# Altium footprint library lib_datalogger.PcbLib: 866 footprints (part 40 of 55)
Each footprint in its own frame and in the unit in brackets; x right, y up, seen from the top. Pads: shape width x height; smd on the part's side, far side on the other; paste and mask are expansions set on the pad; w line width, h text height; cw(c..) or ccw(c..) is an arc to the next point about the centre after c.
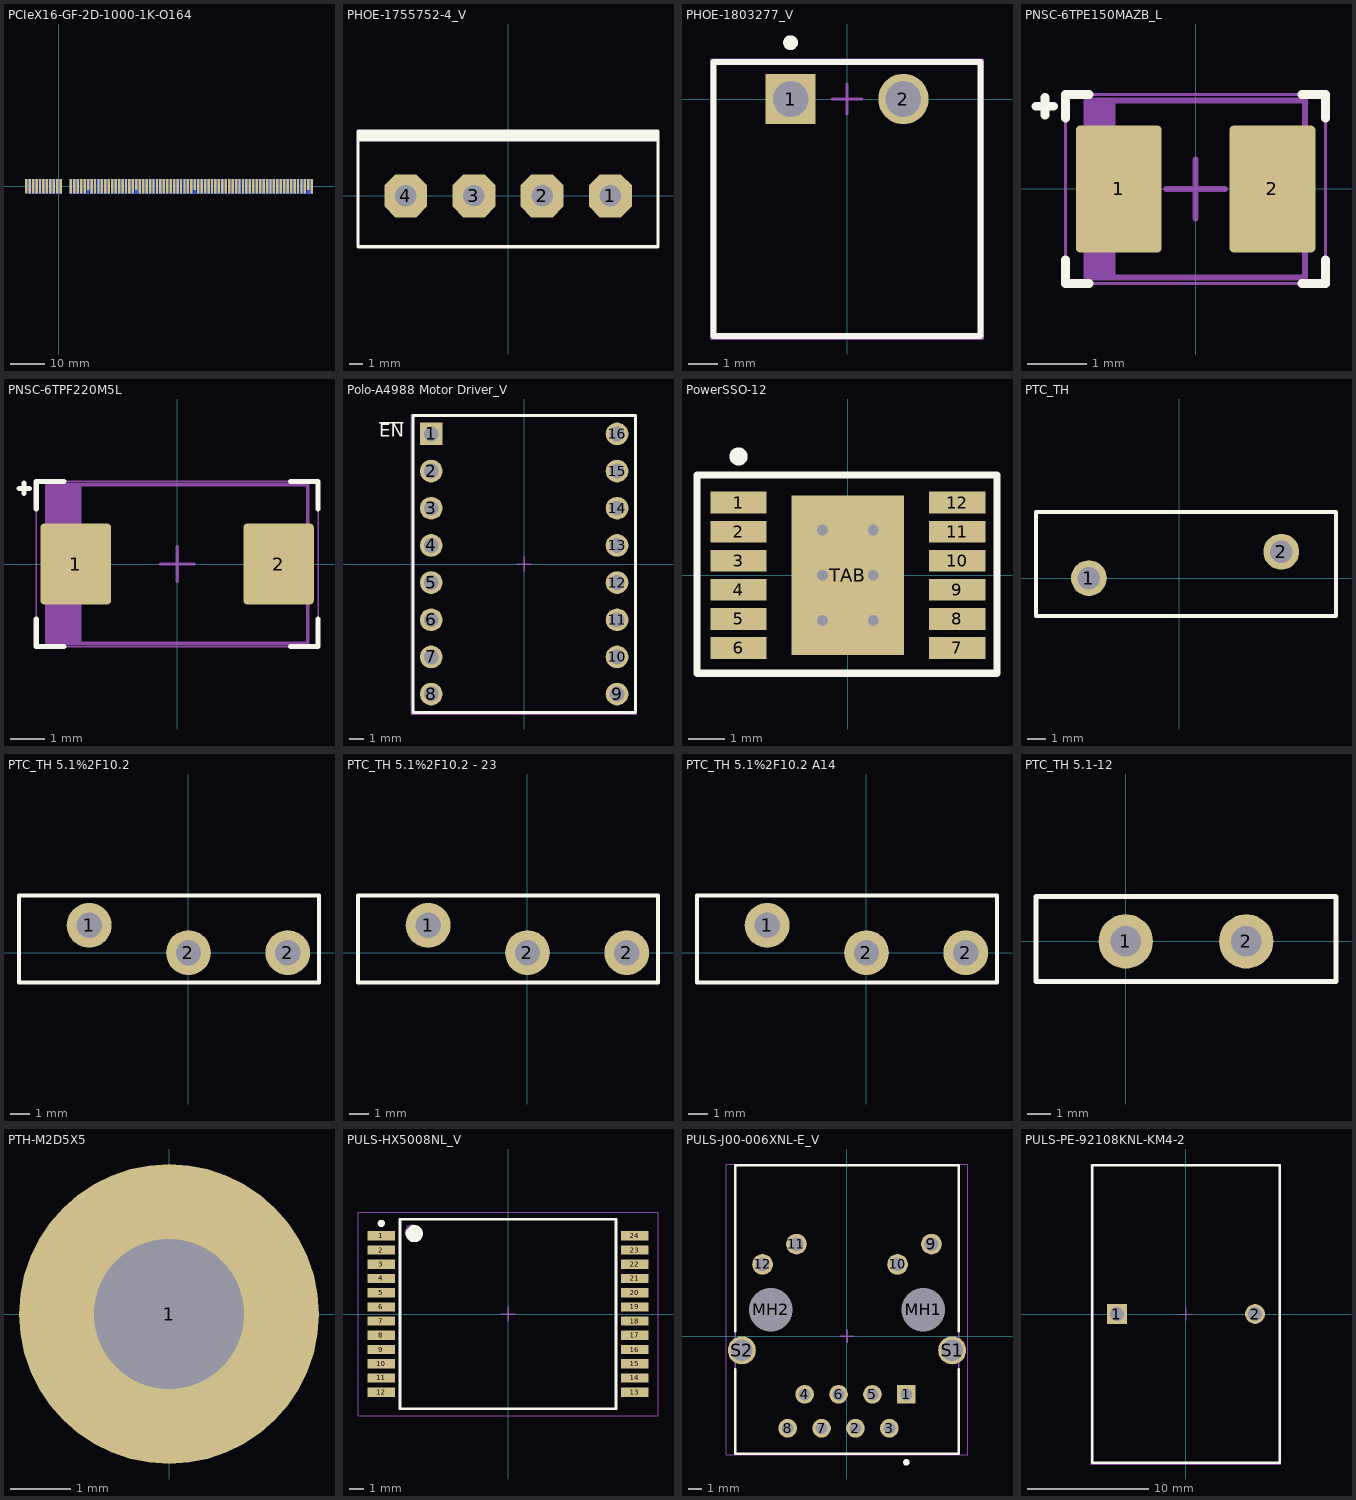
[diagram p39: the footprints below, top view; thin cyan lines are the x and y axes]

## PCIeX16-GF-2D-1000-1K-O164 [mm] "Golden finger, PCIeX16, Dual, Opposite, Pitch 1mm, 164-Position"
pads (164):
  rect 0.7x3.2 smd far side paste-1: A1(-9.5,0.5)
  rect 0.7x4.2 smd far side paste-1: A2(-8.5,0) A3(-7.5,0) A4(-6.5,0) A5(-5.5,0) A6(-4.5,0) A7(-3.5,0) A8(-2.5,0) A9(-1.5,0) A10(-0.5,0) A11(0.5,0) A12(3.5,0) A13(4.5,0) A14(5.5,0) A15(6.5,0) A16(7.5,0) A17(8.5,0) A18(9.5,0) A19(10.5,0) A20(11.5,0) A21(12.5,0) A22(13.5,0) A23(14.5,0) A24(15.5,0) A25(16.5,0) A26(17.5,0) A27(18.5,0) A28(19.5,0) A29(20.5,0) A30(21.5,0) A31(22.5,0) A32(23.5,0) A33(24.5,0) A34(25.5,0) A35(26.5,0) A36(27.5,0) A37(28.5,0) A38(29.5,0) A39(30.5,0) A40(31.5,0) A41(32.5,0) A42(33.5,0) A43(34.5,0) A44(35.5,0) A45(36.5,0) A46(37.5,0) A47(38.5,0) A48(39.5,0) A49(40.5,0) A50(41.5,0) A51(42.5,0) A52(43.5,0) A53(44.5,0) A54(45.5,0) A55(46.5,0) A56(47.5,0) A57(48.5,0) A58(49.5,0) A59(50.5,0) A60(51.5,0) A61(52.5,0) A62(53.5,0) A63(54.5,0) A64(55.5,0) A65(56.5,0) A66(57.5,0) A67(58.5,0) A68(59.5,0) A69(60.5,0) A70(61.5,0) A71(62.5,0) A72(63.5,0) A73(64.5,0) A74(65.5,0) A75(66.5,0) A76(67.5,0) A77(68.5,0) A78(69.5,0) A79(70.5,0) A80(71.5,0) A81(72.5,0) A82(73.5,0)
  rect 0.7x4.2 smd paste-1: B1(-9.5,0) B2(-8.5,0) B3(-7.5,0) B4(-6.5,0) B5(-5.5,0) B6(-4.5,0) B7(-3.5,0) B8(-2.5,0) B9(-1.5,0) B10(-0.5,0) B11(0.5,0) B12(3.5,0) B13(4.5,0) B14(5.5,0) B15(6.5,0) B16(7.5,0) B18(9.5,0) B19(10.5,0) B20(11.5,0) B21(12.5,0) B22(13.5,0) B23(14.5,0) B24(15.5,0) B25(16.5,0) B26(17.5,0) B27(18.5,0) B28(19.5,0) B29(20.5,0) B30(21.5,0) B32(23.5,0) B33(24.5,0) B34(25.5,0) B35(26.5,0) B36(27.5,0) B37(28.5,0) B38(29.5,0) B39(30.5,0) B40(31.5,0) B41(32.5,0) B42(33.5,0) B43(34.5,0) B44(35.5,0) B45(36.5,0) B46(37.5,0) B47(38.5,0) B49(40.5,0) B50(41.5,0) B51(42.5,0) B52(43.5,0) B53(44.5,0) B54(45.5,0) B55(46.5,0) B56(47.5,0) B57(48.5,0) B58(49.5,0) B59(50.5,0) B60(51.5,0) B61(52.5,0) B62(53.5,0) B63(54.5,0) B64(55.5,0) B65(56.5,0) B66(57.5,0) B67(58.5,0) B68(59.5,0) B69(60.5,0) B70(61.5,0) B71(62.5,0) B72(63.5,0) B73(64.5,0) B74(65.5,0) B75(66.5,0) B76(67.5,0) B77(68.5,0) B78(69.5,0) B79(70.5,0) B80(71.5,0) B82(73.5,0)
  rect 0.7x3.2 smd paste-1: B17(8.5,0.5) B31(22.5,0.5) B48(39.5,0.5) B81(72.5,0.5)
Top Solder:
  rectangle: -10.4,-3.75 74.4,2.225
Bottom Solder:
  rectangle: -10.4,-3.75 74.4,2.225

## PHOE-1755752-4_V [mil] "TH, 4-Leads, Body 21.32x8.6mm, Pitch 5.08mm"
height 472.44
pads (4):
  oct 126x126 hole 63: 1(300,0) 2(100,0) 3(-100,0) 4(-300,0)
Top Overlay:
  region: 440,160 -440,160 -440,190 440,190
  lines w10: -440,-150 440,-150 440,190 -440,190 -440,-150
3D body "1755752.SLDPRT": height 472.44, standoff -153.54, extent -439.37,-143.58 439.37,195

## PHOE-1803277_V [mm] "CONN, Body 9.2x9.01mm, Pitch 3.81mm"
height 7.25
pads (2):
  rect 1.7x1.7 hole 1.2: 1(-1.905,0)
  round 1.7 hole 1.2: 2(1.905,0)
Top Overlay:
  circle w0.25: c-1.905,1.9 r0.125
  lines w0.2: -4.505,-8 4.505,-8 4.505,1.25 -4.505,1.25 -4.505,-8
Mechanical 13:
  lines w0.1: -4.505,-8 -4.505,1.2 4.505,1.2 4.505,-8 -4.505,-8
Mechanical 15:
  lines w0.05: -4.605,-8.1 4.605,-8.1 4.605,1.35 -4.605,1.35 -4.605,-8.1
  lines w0.1: -0.5,0 0.5,0 ; 0,-0.5 0,0.5
3D body "1803277.stp": height 7.25, standoff -3.4, extent -4.505,-8 4.505,1.3

## PNSC-6TPE150MAZB_L [mm] "Molded Capacitor, 2-Leads, Body 3.70x3mm, IPC High Density"
height 2
pads (2):
  rrect10% 1.45x2.15 smd: 1(-1.3,0) 2(1.3,0)
Top Overlay:
  lines w0.15: -2.7,1.4 -2.4,1.4 ; -2.55,1.25 -2.55,1.55 ; -2.2,-1.2 -2.2,-1.6 -1.8,-1.6 ; -2.2,1.2 -2.2,1.6 -1.8,1.6 ; 1.8,-1.6 2.2,-1.6 2.2,-1.2 ; 1.8,1.6 2.2,1.6 2.2,1.2
Mechanical 13:
  lines w0.1: -1.85,-1.5 1.85,-1.5 1.85,1.5 -1.85,1.5 -1.85,-1.5
Mechanical 15:
  lines w0.05: -2.2,-1.6 2.2,-1.6 2.2,1.6 -2.2,1.6 -2.2,-1.6
  lines w0.1: -0.5,0 0.5,0 ; 0,-0.5 0,0.5
Top 3D Body:
  rectangle: -1.85,-1.5 -1.352,1.5
Top Designator:
  text ".Designator" at 0.127,-1.27 h0.6
3D body "CAPMP3528X20L.step": height 2, standoff 0, extent -2.07,-1.5 2.07,1.5

## PNSC-6TPF220M5L [mm] "Molded Capacitor, 2-Leads, Body 7.60x4.60mm, IPC High Density"
height 3
pads (2):
  rrect10% 2.05x2.35 smd: 1(-2.95,0) 2(2.95,0)
Top Overlay:
  lines w0.15: -4.6,2.2 -4.3,2.2 ; -4.45,2.05 -4.45,2.35 ; -4.1,-1.6 -4.1,-2.4 -3.3,-2.4 ; -4.1,1.6 -4.1,2.4 -3.3,2.4 ; 3.3,-2.4 4.1,-2.4 4.1,-1.6 ; 3.3,2.4 4.1,2.4 4.1,1.6
Mechanical 13:
  rectangle: -3.8,-2.3 -2.778,2.3
  lines w0.1: -3.8,-2.3 3.8,-2.3 3.8,2.3 -3.8,2.3 -3.8,-2.3
Mechanical 15:
  lines w0.05: -4.1,-2.4 4.1,-2.4 4.1,2.4 -4.1,2.4 -4.1,-2.4
  lines w0.1: -0.5,0 0.5,0 ; 0,-0.5 0,0.5
Top Designator:
  text ".Designator" at -1.27,-0.127 h0.6
3D body "CAPMP7343X30L.step": height 3, standoff 0, extent -4.02,-2.3 4.02,2.3

## Polo-A4988 Motor Driver_V [mm] "THD, 16-Leads, Body 20.3x15.2mm, Pitch 2.54mm"
height 5.87
pads (16):
  rect 1.55x1.55 hole 1.02: 1(-6.35,8.89)
  round 1.55 hole 1.02: 2(-6.35,6.35) 3(-6.35,3.81) 4(-6.35,1.27) 5(-6.35,-1.27) 6(-6.35,-3.81) 7(-6.35,-6.35) 8(-6.35,-8.89) 9(6.35,-8.89) 10(6.35,-6.35) 11(6.35,-3.81) 12(6.35,-1.27) 13(6.35,1.27) 14(6.35,3.81) 15(6.35,6.35) 16(6.35,8.89)
Top Overlay:
  lines w0.1: -9.906,9.652 -8.255,9.652
  lines w0.2: -7.6,-10.15 7.6,-10.15 7.6,10.15 -7.6,10.15 -7.6,-10.15
  text "EN" at -9.906,8.382 h1.52
Mechanical 13:
  lines w0.1: -7.6,-10.15 -7.6,10.15 7.6,10.15 7.6,-10.15 -7.6,-10.15
Mechanical 15:
  lines w0.05: -7.7,-10.25 -7.7,10.25 7.7,10.25 7.7,-10.25 -7.7,-10.25
  lines w0.1: -0.5,0 0.5,0 ; 0,-0.5 0,0.5
3D body "User Library-A4988.STEP": height 5.04, standoff -5.12, extent -7.62,-10.16 7.62,10.16

## PowerSSO-12 [mm]
height 1.7
pads (13):
  rect 1.55x0.6 smd: 1(-3.007,2) 2(-3.007,1.2) 3(-3.007,0.4) 4(-3.007,-0.4) 5(-3.007,-1.2) 6(-3.007,-2) 7(3.007,-2) 8(3.007,-1.2) 9(3.007,-0.4) 10(3.007,0.4) 11(3.007,1.2) 12(3.007,2)
  rect 3.1x4.4 smd: TAB(0,0)
via 0.7,0 diameter 0.3 hole 0.3
via 0.7,1.25 diameter 0.3 hole 0.3
via 0.7,-1.25 diameter 0.3 hole 0.3
via -0.7,-1.25 diameter 0.3 hole 0.3
via -0.7,1.25 diameter 0.3 hole 0.3
via -0.7,0 diameter 0.3 hole 0.3
Top Overlay:
  circle w0.25: c-3.007,3.27 r0.125
  lines w0.2: -4.15,-2.699 -4.15,2.762 4.105,2.762 4.105,-2.699 -4.15,-2.699
3D body "PowerSSO-12.step": height 1.64, standoff 0, extent -3.1,-2.5 3.1,2.5

## PTC_TH [mm] "Jumper Wire; 2 Leads"
height 0.6
pads (2):
  round 1.9 hole 1.2: 1(-4.8,0) 2(5.4,1.4)
Top Overlay:
  lines w0.2: -7.6,-2 8.3,-2 8.3,3.5 -7.6,3.5 -7.6,-2
3D body "User Library-RXEF375.STEP": height 32.25, standoff -7.13, extent -13.289,-1.05 13.889,2.4

## PTC_TH 5.1%2F10.2 [mm] "Jumper Wire; 2 Leads"
height 0.6
pads (3):
  round 2.3 hole 1.3: 1(-5.1,1.4) 2(0,0) 2(5.1,0)
Top Overlay:
  lines w0.2: -8.7,-1.54 -8.7,2.94 6.7,2.94 6.7,-1.54 -8.7,-1.54
3D body "mf-rx090_72-0.stp": height 19.85, standoff -4.7, extent -8.45,-0.95 3.25,2.15

## PTC_TH 5.1%2F10.2 - 23 [mm] "Jumper Wire; 2 Leads"
height 0.6
pads (3):
  round 2.3 hole 1.3: 1(-5.1,1.4) 2(0,0) 2(5.1,0)
Top Overlay:
  lines w0.2: -8.7,-1.54 -8.7,2.94 6.7,2.94 6.7,-1.54 -8.7,-1.54
3D body "mf-rht1300-0.stp": height 29.75, standoff -6.55, extent -11.8,-1.1 11.7,2.5

## PTC_TH 5.1%2F10.2 A14 [mm] "Jumper Wire; 2 Leads"
height 0.6
pads (3):
  round 2.3 hole 1.3: 1(-5.1,1.4) 2(0,0) 2(5.1,0)
Top Overlay:
  lines w0.2: -8.7,-1.54 -8.7,2.94 6.7,2.94 6.7,-1.54 -8.7,-1.54
3D body "70407861.stp": height 22, standoff -9.1, extent -9.6,-0.8 4.4,2.2

## PTC_TH 5.1-12 [mm] "Jumper Wire; 2 Leads"
height 0.6
pads (2):
  round 2.3 hole 1.3: 1(0,0) 2(5.1,0)
Top Overlay:
  lines w0.2: -3.8,-1.7 -3.8,1.9 8.9,1.9 8.9,-1.7 -3.8,-1.7
3D body "User Library-MF-R300.STEP": height 19, standoff -6.9, extent -3.4,-1.44 8.6,1.6

## PTH-M2D5X5 [mm]
pads (1):
  round 5 hole 2.5: 1(0,0)
Top Designator:
  text ".Designator" at -1.397,2.921 h0.6

## PULS-HX5008NL_V [mm] "SOP, 24-Leads, Body 15.1x13.2mm, Pitch 0.99mm"
height 6.12
pads (24):
  rect 1.905x0.64 smd: 1(-8.828,5.445) 2(-8.828,4.455) 3(-8.828,3.465) 4(-8.828,2.475) 5(-8.828,1.485) 6(-8.828,0.495) 7(-8.828,-0.495) 8(-8.828,-1.485) 9(-8.828,-2.475) 10(-8.828,-3.465) 11(-8.828,-4.455) 12(-8.828,-5.445) 13(8.827,-5.445) 14(8.827,-4.455) 15(8.827,-3.465) 16(8.827,-2.475) 17(8.827,-1.485) 18(8.827,-0.495) 19(8.827,0.495) 20(8.827,1.485) 21(8.827,2.475) 22(8.827,3.465) 23(8.827,4.455) 24(8.827,5.445)
Top Overlay:
  circle w0.25: c-8.828,6.315 r0.125
  circle w0.6: c-6.525,5.6 r0.3
  lines w0.2: -7.525,-6.6 -7.525,6.6 7.525,6.6 7.525,-6.6 -7.525,-6.6
Mechanical 13:
  circle w0.1: c-6.65,5.7 r0.5
  lines w0.1: -7.55,-6.6 -7.55,6.6 7.55,6.6 7.55,-6.6 -7.55,-6.6
Mechanical 15:
  lines w0.05: -10.45,-7.1 -10.45,7.1 10.45,7.1 10.45,-7.1 -10.45,-7.1
  lines w0.1: -0.5,0 0.5,0 ; 0,-0.5 0,0.5
3D body "SOP99P1870X612-24M.step": height 6.12, standoff 0, extent -9.335,-6.6 9.335,6.6

## PULS-J00-006XNL-E_V [mm] "THD, 12-Leads, Body 21.59x16.26mm, Pitch 1.27mm"
height 13.84
pads (16):
  rect 1.4x1.4 hole 0.89: 1(4.445,-4.355)
  round 1.4 hole 0.89: 2(0.635,-6.895) 3(3.175,-6.895) 4(-3.175,-4.355) 5(1.905,-4.355) 6(-0.635,-4.355) 7(-1.905,-6.895) 8(-4.445,-6.895)
  round 1.55 hole 1.02: 9(6.325,6.895) 10(3.785,5.375) 11(-3.785,6.895) 12(-6.325,5.375)
  round 2.95 hole 3.25: MH1(5.715,1.995) MH2(-5.715,1.995)
  round 2.1 hole 1.6: S1(7.875,-1.055) S2(-7.875,-1.055)
Top Overlay:
  circle w0.25: c4.445,-9.445 r0.125
  lines w0.2: -8.38,-2.482 -8.38,-8.795 8.38,-8.795 ; -8.38,0.372 -8.38,12.795 8.38,12.795 ; 8.38,-8.796 8.379,-8.795 ; 8.38,-2.482 8.38,-8.795 ; 8.38,0.372 8.38,12.795 ; 8.38,12.794 8.379,12.795
Mechanical 13:
  lines w0.1: -8.38,-8.795 8.38,-8.795 8.38,12.795 -8.38,12.795 -8.38,-8.795
Mechanical 15:
  lines w0.05: -9.025,-8.895 -9.025,12.895 9.025,12.895 9.025,-8.895 -9.025,-8.895
  lines w0.1: -0.5,0 0.5,0 ; 0,-0.5 0,0.5
3D body: height 14.22, standoff 3, extent 5.08,11.43 8.38,12.795
3D body: height 3, standoff 0, extent -8.38,11.43 -5.08,12.795
3D body: height 14.22, standoff 0, extent -5.08,11.43 5.08,12.795
3D body: height 3, standoff 0, extent 5.08,11.43 8.38,12.795
3D body: height 14.22, standoff 3, extent -8.38,11.43 -5.08,12.795
3D body: height 14.22, standoff 0, extent -8.38,-8.795 8.38,11.43

## PULS-PE-92108KNL-KM4-2 [mm] "THD, 2-Leads, Body 24.64x15.5mm"
height 27.94
pads (2):
  rect 1.65x1.65 hole 1.15: 1(-5.72,0)
  round 1.65 hole 1.15: 2(5.72,0)
Top Overlay:
  lines w0.2: -7.75,-12.32 -7.75,12.32 7.75,12.32 7.75,-12.32 -7.75,-12.32
Mechanical 13:
  circle w0.1: c5.72,0 r0.445
  circle w0.1: c-5.72,0 r0.445
  lines w0.1: -7.75,-12.32 7.75,-12.32 7.75,12.32 -7.75,12.32 -7.75,-12.32
Mechanical 15:
  lines w0.05: -7.85,-12.42 -7.85,12.42 7.85,12.42 7.85,-12.42 -7.85,-12.42
  lines w0.1: -0.5,0 0.5,0 ; 0,-0.5 0,0.5
3D body: height 0, standoff -9.58, extent 5.276,-0.444 6.164,0.444
3D body: height 0, standoff -9.58, extent -6.164,-0.444 -5.276,0.444
3D body: height 27.94, standoff 0, extent -7.75,-12.32 7.75,12.32